# Altium schematic symbol library Sang_library.SchLib: 1607 symbols (part 6 of 15) (continued)
## FT232RL (continued)
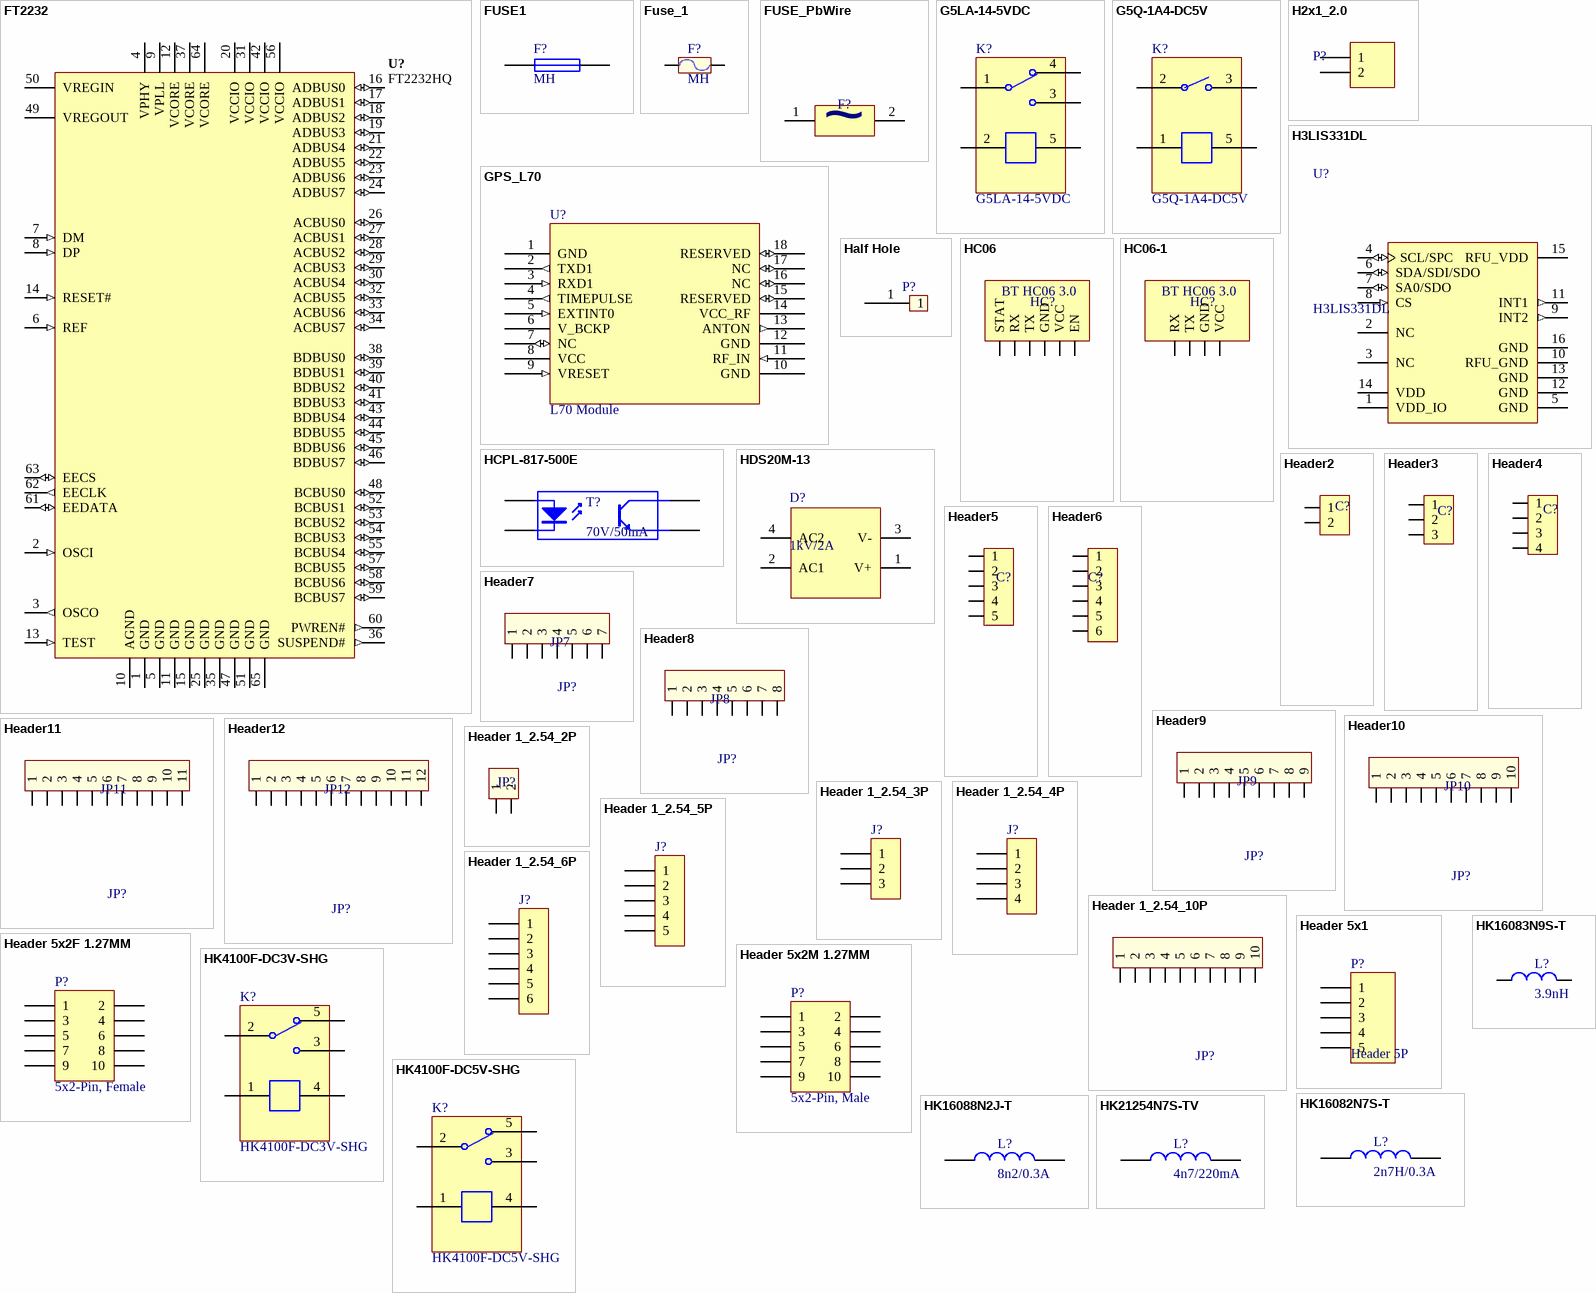
[diagram p41: symbols FT2232 to HK21254N7S-TV]

## FT2232
designator U?, comment FT2232HQ
Dual High Speed USB To Multipurpose UART/FIFO IC, QFN-64, Tray; DatasheetVersion: ver 2.10, Nov-2010; ComponentLink1Description: Manufacturer URL; PackageVersion: 2010; ComponentLink1URL: http://www.ftdichip.com/; PackageReference: QFN64_2; PackageDescription: 64-Pin Quad Flat No-Lead, 9 x 9 mm Body, 0.5 mm Pitch, 4.35 x 4.35 mm Exposed Pad; RevisionNote: URLs added.; ComponentLink2URL: http://www.ftdichip.com/Support/Documents/DataSheets/ICs/DS_FT2232H.pdf; ComponentLink2Description: Datasheet
footprint QFN64M (QFN, 64-Leads, Body 9x9mm, Pitch 0.5mm, IPC High Density)
pins: 1 GND (power), 2 OSCI (in), 3 OSCO (out), 4 VPHY (power), 5 GND (power), 6 REF (in), 7 DM (in), 8 DP (in), 9 VPLL (power), 10 AGND (power), 11 GND (power), 12 VCORE (power), 13 TEST (in), 14 RESET# (in), 15 GND (power), 16 ADBUS0 (io), 17 ADBUS1 (io), 18 ADBUS2 (io), 19 ADBUS3 (io), 20 VCCIO (power), 21 ADBUS4 (io), 22 ADBUS5 (io), 23 ADBUS6 (io), 24 ADBUS7 (io), 25 GND (power), 26 ACBUS0 (io), 27 ACBUS1 (io), 28 ACBUS2 (io), 29 ACBUS3 (io), 30 ACBUS4 (io), 31 VCCIO (power), 32 ACBUS5 (io), 33 ACBUS6 (io), 34 ACBUS7 (io), 35 GND (power), 36 SUSPEND# (out), 37 VCORE (power), 38 BDBUS0 (io), 39 BDBUS1 (io), 40 BDBUS2 (io), 41 BDBUS3 (io), 42 VCCIO (power), 43 BDBUS4 (io), 44 BDBUS5 (io), 45 BDBUS6 (io), 46 BDBUS7 (io), 47 GND (power), 48 BCBUS0 (io), 49 VREGOUT (power), 50 VREGIN (power), 51 GND (power), 52 BCBUS1 (io), 53 BCBUS2 (io), 54 BCBUS3 (io), 55 BCBUS4 (io), 56 VCCIO (power), 57 BCBUS5 (io), 58 BCBUS6 (io), 59 BCBUS7 (io), 60 PWREN# (out), 61 EEDATA (io), 62 EECLK (out), 63 EECS (io), 64 VCORE (power), 65 GND (power)

## FUSE1
designator F?, comment MH
Cắm; Value: *
pins: 1, 2

## Fuse_1
designator F?, comment MH
Dán; Value: Fuse
footprint Fuse (3A)
footprint FUSE1 (De Fuse Box)
footprint FUSE2 (Fuse)
footprint CAU TRI (Cau Tri)
pins: 1, 2

## FUSE_PbWire
designator F?
PB wire fuse; Solder: SMT; CompanyID: VT-xxxx
footprint FUSE_3A_HOLDER
pins: 1, 2
text: ~

## G5LA-14-5VDC
designator K?
5V, 5pin, 10A; Solder: HAND; MPN: G5LA-14-5VDC; CompanyID: *; Value: G5LA-14-5VDC
footprint G5LA-14 (Footprint not found)
pins: 1, 2, 3, 4, 5

## G5Q-1A4-DC5V
designator K?
5V, 5pin, 10A; MPN: G5LA-14-5VDC; Solder: HAND; Value: G5LA-14-5VDC; CompanyID: *
footprint G5Q-1A4-DC5
pins: 1 2, 2, 3, 5

## GPS_L70
designator U?, comment L70 Module
L70 GPS module; Solder: SMT; Value: L70B; MPN: L70B; Category: MODULE
footprint GPS.L70
pins: 1 GND (power), 2 TXD1 (out), 3 RXD1 (in), 4 TIMEPULSE (out), 5 EXTINT0 (in), 6 V_BCKP (power), 7 NC (io), 8 VCC (power), 9 VRESET (in), 10 GND (power), 11 RF_IN (in), 12 GND (power), 13 ANTON (out), 14 VCC_RF (power), 15 RESERVED (io), 16 NC (io), 17 NC (io), 18 RESERVED (io)

## H2x1_2.0
designator P?
Header 2x1, pitch 2mm; Solder: WAVE
footprint HDR200_1x2
pins: 1, 2

## H3LIS331DL
designator U?
ACCEL 100-400G I2C/SPI 16TFLGA; MFR: STMicroelectronics; Solder: SMT; MPN: H3LIS331DL; Value: H3LIS331DL; Category: IC; PinCount: 16
footprint STM-LGA-16_N (Footprint not found)
pins: 1 VDD_IO (power) "Power supply for I/O pins", 2 NC "Not connected", 3 NC "Not connected", 4 SCL/SPC (io) "I2C serial clock (SCL),SPI serial port clock (SPC)", 5 GND (power) "0V supply", 6 SDA/SDI/SDO (io) "I2C serial data (SDA),SPI serial data input (SDI),3-wire interface serial data output (SDO)", 7 SA0/SDO (io) "SPI serial data output (SDO),I2C less significant bit of the device address (SA0)", 8 CS (in) "SPI enable I2C/SPI mode selection (1: I2C mode; 0: SPI enabled)", 9 INT2 (out) "Inertial interrupt 2", 10 RFU_GND (power) "Connect to GND", 11 INT1 (out) "Inertial interrupt 1", 12 GND (power) "0 V supply", 13 GND (power) "Analog to digital converter input 3", 14 VDD (power) "Power supply", 15 RFU_VDD (power), 16 GND (power) "Analog to digital converter input 1"

## Half Hole
designator P?, comment 1  (value not drawn)
footprint Hafl Hole 0.7mm
pins: 1

## HC06
designator HC?
Manufacturer: W¨¹rth Elektronik eiSos GmbH; partNo: 613004143121; ComponentLink1 Description: Manufacturer; ComponentLink2 Description: Datasheet; NoPins: 04; Created Date: 29 March 2013; ComponentLink1URL: http://www.we-online.com; ComponentLink2URL: http://katalog.we-online.de/em/datasheet/6130xx143121.pdf; Created by: Karrer Zheng
footprint HC06
footprint JP6-C1T (6 row, straight, gold plating)
pins: 1 STAT, 2 RX, 3 TX, 4 GND, 5 VCC, 6 EN
text: BT HC06 3.0

## HC06-1
designator HC?
Manufacturer: W¨¹rth Elektronik eiSos GmbH; partNo: 613004143121; ComponentLink1 Description: Manufacturer; ComponentLink2 Description: Datasheet; NoPins: 04; Created Date: 29 March 2013; ComponentLink1URL: http://www.we-online.com; ComponentLink2URL: http://katalog.we-online.de/em/datasheet/6130xx143121.pdf; Created by: Karrer Zheng
footprint HC06-1
footprint JP4-C1T (4 row, straight, gold plating)
pins: 1 RX, 2 TX, 3 GND, 4 VCC
text: BT HC06 3.0

## HCPL-817-500E
designator T?, comment 70V/50mA
OPTOISOLATOR 5KV TRANSISTOR 4SMD; MPN: HCPL-817-500E; Solder: SMT; CompanyID: VT-00147; Value: 70V/50mA
footprint OPTO TRANSISTOR_SMD-4
pins: 1, 2, 3, 4

## HDS20M-13
designator D?, comment 1kV/2A
BRIDGE RECT 1PHASE 1KV 2A HDS; MPN: HDS20M-13; Solder: SMT; Value: 1kV/2A; MFR: *
footprint DIODE_Bridge SMD
pins: 1 V+, 2 AC1, 3 V-, 4 AC2

## Header2
designator C?
Header IDC, 2 x 1 Pin Vertical 2.54mm Pitch (Non-Boxed, Male); Manufacturer: W¨¹rth Elektronik eiSos GmbH; partNo: 613002143121; ComponentLink1 Description: Manufacturer; ComponentLink2 Description: Datasheet; NoPins: 02; Created Date: 29 March 2013; ComponentLink1URL: http://www.we-online.com; ComponentLink2URL: http://katalog.we-online.de/em/datasheet/6130xx143121.pdf; Created by: Karrer Zheng
footprint HDR2 (Connector; Header; 2 Position)
footprint Header2 (CON2)
footprint Header2N (CON2)
pins: 1, 2

## Header3
designator C?
Header IDC, 3 x 1 Pin Vertical 2.54mm Pitch (Non-Boxed, Male); Manufacturer: W¨¹rth Elektronik eiSos GmbH; partNo: 613002143121; ComponentLink1 Description: Manufacturer; ComponentLink2 Description: Datasheet; NoPins: 02; Created Date: 29 March 2013; ComponentLink1URL: http://www.we-online.com; ComponentLink2URL: http://katalog.we-online.de/em/datasheet/6130xx143121.pdf; Created by: Karrer Zheng
footprint HDR3 (Connector; Header; 3 Position)
footprint Header3 (CON 3)
footprint Header3N (CON 3)
pins: 1, 2, 3

## Header4
designator C?
Header IDC, 4 x 1 Pin Vertical 2.54mm Pitch (Non-Boxed, Male); Manufacturer: W¨¹rth Elektronik eiSos GmbH; partNo: 613002143121; ComponentLink1 Description: Manufacturer; ComponentLink2 Description: Datasheet; NoPins: 02; Created Date: 29 March 2013; ComponentLink1URL: http://www.we-online.com; ComponentLink2URL: http://katalog.we-online.de/em/datasheet/6130xx143121.pdf; Created by: Karrer Zheng
footprint HDR4 (Connector; Header; 4 Position)
footprint Header4 (CON4)
footprint Header4N (CON4)
pins: 1, 2, 3, 4

## Header5
designator C?
Header IDC, 5 x 1 Pin Vertical 2.54mm Pitch (Non-Boxed, Male); Manufacturer: W¨¹rth Elektronik eiSos GmbH; partNo: 613002143121; ComponentLink1 Description: Manufacturer; ComponentLink2 Description: Datasheet; NoPins: 02; Created Date: 29 March 2013; ComponentLink1URL: http://www.we-online.com; ComponentLink2URL: http://katalog.we-online.de/em/datasheet/6130xx143121.pdf; Created by: Karrer Zheng
footprint HDR5 (Connector; Header; 5 Position)
footprint Header5 (CON5)
footprint Header5N (CON5)
pins: 1, 2, 3, 4, 5

## Header6
designator C?
Header IDC, 6 x 1 Pin Vertical 2.54mm Pitch (Non-Boxed, Male); Manufacturer: W¨¹rth Elektronik eiSos GmbH; partNo: 613002143121; ComponentLink1 Description: Manufacturer; ComponentLink2 Description: Datasheet; NoPins: 02; Created Date: 29 March 2013; ComponentLink1URL: http://www.we-online.com; ComponentLink2URL: http://katalog.we-online.de/em/datasheet/6130xx143121.pdf; Created by: Karrer Zheng
footprint HDR6 (Connector; Header; 6 Position)
footprint Header6 (CON6)
footprint Header6N (CON6)
pins: 1, 2, 3, 4, 5, 6

## Header7
designator JP?, comment JP7
Connector 7; Value: Connector 7
footprint Header7 (CON7)
footprint Header7N (CON7)
pins: 1, 2, 3, 4, 5, 6, 7

## Header8
designator JP?, comment JP8
Connector 8; Value: Connector 8
footprint Header8 (CON8)
footprint Header8N (CON8)
pins: 1, 2, 3, 4, 5, 6, 7, 8

## Header9
designator JP?, comment JP9
Connector 9; Value: Connector 9
footprint Header9 (CON9)
footprint Header9N (CON9)
pins: 1, 2, 3, 4, 5, 6, 7, 8, 9

## Header10
designator JP?, comment JP10
Connector 10; Value: Connector 10
footprint Header10 (CON10)
footprint Header10N (CON10)
pins: 1, 2, 3, 4, 5, 6, 7, 8, 9, 10

## Header11
designator JP?, comment JP11
Connector 11; Value: Connector 11
footprint Header11 (CON11)
footprint Header11N (CON11)
pins: 1, 2, 3, 4, 5, 6, 7, 8, 9, 10, 11

## Header12
designator JP?, comment JP12
Connector 12; Value: Connector 12
footprint Header12 (CON12)
footprint Header12N (CON12)
pins: 1, 2, 3, 4, 5, 6, 7, 8, 9, 10, 11, 12

## Header 1_2.54_2P
designator JP?
Cắm; Chung_Loai: Cắm
footprint Header_Duc Cong_2P 2.54
pins: 1, 2

## Header 1_2.54_3P
designator J?
Cắm; Ma_Hang: *; Ghi_Chu: *; Don_Vi: *; Kieu_Chan: *; Chung_Loai: Cắm
footprint Header_Duc Cong_3P 2.54
pins: 1, 2, 3

## Header 1_2.54_4P
designator J?
Cắm; Chung_Loai: Cắm
footprint CON4
footprint Header_Duc Cong_4P 2.54
pins: 1, 2, 3, 4

## Header 1_2.54_5P
designator J?
Cắm; Chung_Loai: Cắm
footprint Header_Duc Cong_5P 2.54
pins: 1, 2, 3, 4, 5

## Header 1_2.54_6P
designator J?
Cắm; Don Vi: Con; Chung_Loai: Cắm
footprint Header_Duc Cong_6P 2.54
pins: 1, 2, 3, 4, 5, 6

## Header 1_2.54_10P
designator JP?
Cắm; Don_Vi: Con; Chung_Loai: Cắm
footprint Header_Duc Thang_10P_2.54
pins: 1, 2, 3, 4, 5, 6, 7, 8, 9, 10

## Header 5x1
designator P?, comment Header 5P
Header, 5 Pin Pitch 2.54mm; MPN: S1012EC-40-ND; CompanyID: VT-00125; Solder: WAVE; Value: Header 5P
footprint HDR1X5 (Connector; Header; 5 Position)
pins: 1, 2, 3, 4, 5

## Header 5x2F 1.27MM
designator P?, comment 5x2-Pin, Female
Header Female, 5x2-Pin, Pitch 1.27mm; MPN: 525674025852; CompanyID: VT-01108; Solder: HAND; Value: 5x2-Pin, Female
footprint HDR_5x2_1.27 FEMALE (HDR127_5x2_FEMALE)
pins: 1, 2, 3, 4, 5, 6, 7, 8, 9, 10

## Header 5x2M 1.27MM
designator P?, comment 5x2-Pin, Male
Header Male, 5x2-Pin, Pitch 1.27mm; MPN: 525673713482; CompanyID: VT-01107; Solder: HAND; Value: 5x2-Pin, Male
footprint HDR_5x2_1.27 MALE (HDR127_5x2_MALE)
pins: 1, 2, 3, 4, 5, 6, 7, 8, 9, 10

## HK4100F-DC3V-SHG
designator K?
3V, 6pin, 3A; Solder: HAND; MPN: HK4100F-DC3V-SHG; CompanyID: *; Value: HK4100F-DC3V
footprint HK4100F (Footprint not found)
pins: 1, 2, 3, 4, 5

## HK4100F-DC5V-SHG
designator K?
5V, 6pin, 3A; Solder: HAND; MPN: HK4100F-DC5V-SHG; CompanyID: *; Value: HK4100F-DC5V
footprint HK4100F (Footprint not found)
pins: 1, 2, 3, 4, 5

## HK16082N7S-T
designator L?, comment 2n7H/0.3A
IND-FIXED 2.7nH +- 0.3nH 300mA 100 mOhm 0603; MPN: HK16082N7S-T; CompanyID: VT-01163; Solder: SMT; Value: 2n7H/0.3A; Category: INDUCTOR
footprint IND-0603 (1608) (Resistor, Chip; 1.60 mm L X 0.80 mm W X 0.50 mm H body)
pins: 1, 2

## HK16083N9S-T
designator L?, comment 3.9nH
FIXED IND 3.9NH 300MA 140 MOHM; MPN: HK16083N9S-T; CompanyID: VT-01060; Solder: SMT; Value: 3.9nH; Category: FERRITE BEAD; PinCount: 2
footprint IND-0603 (1608) (Resistor, Chip; 1.60 mm L X 0.80 mm W X 0.50 mm H body)
pins: 1, 2

## HK16088N2J-T
designator L?, comment 8n2/0.3A
FIXED IND 8.2nH 300mA 240 mOHM; MPN: HK16088N2J-T; Solder: SMT; CompanyID: VT-01352; Value: 8n2/0.3A; Category: INDUCTOR
footprint INDUCTOR-0603 (Inductor, Chip; 1.60 mm L X 0.80 mm W X 1.40 mm H body)
pins: 1, 2

## HK21254N7S-TV
designator L?, comment 4n7/220mA
IND-FIXED 4.7nH 220mA 200 mOhm 0805; MPN: HK21254N7S-TV; Solder: SMT; CompanyID: VT-00954; Value: 4n7/220mA; Category: INDUCTOR
footprint INDUCTOR-0805 (Inductor, Chip; 2.00 mm L X 1.25 mm W X 1.50 mm H body)
pins: 1, 2

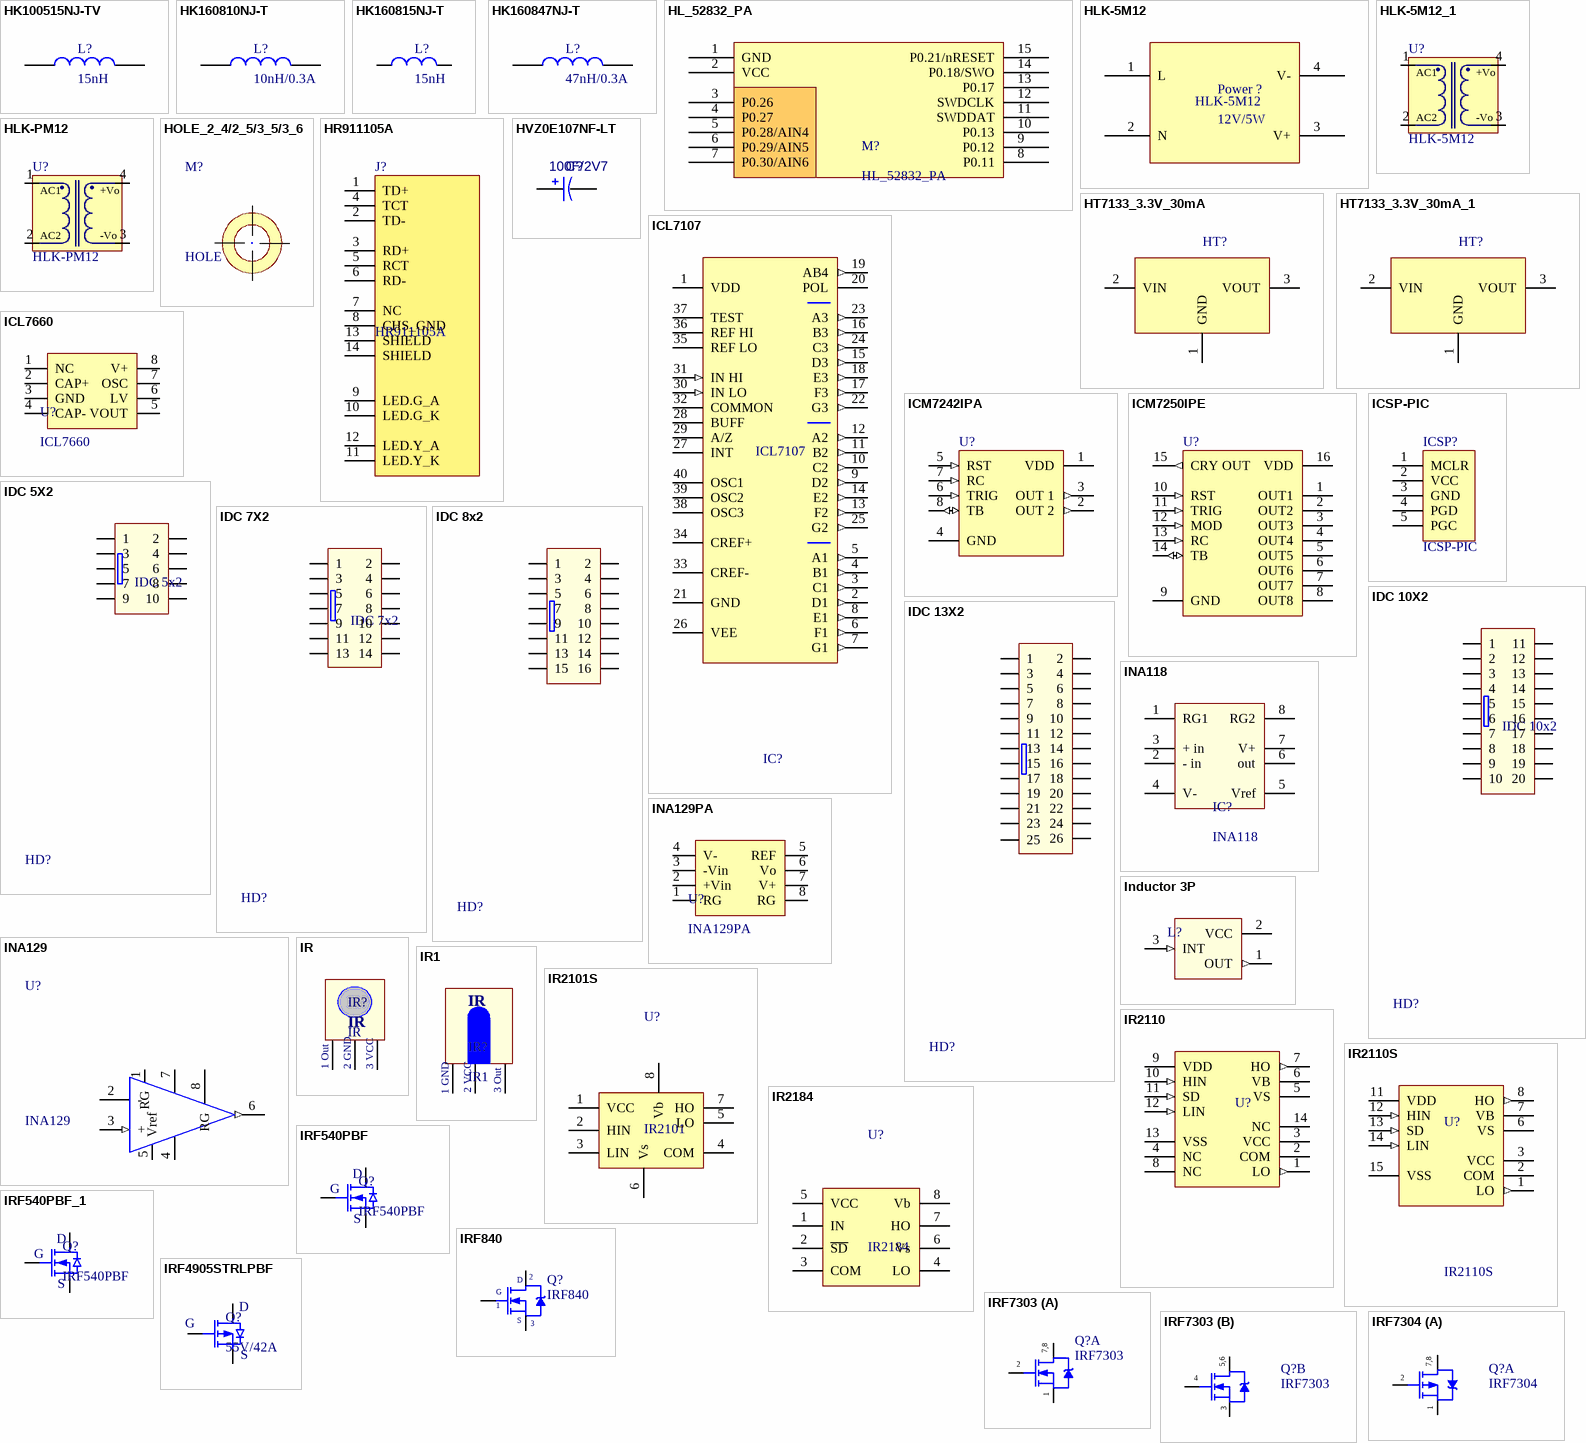
[diagram p42: symbols HK100515NJ-TV to IRF7304]

## HK100515NJ-TV
designator L?, comment 15nH
FIXED IND 15NH 300MA 460 MOHM; MPN: HK100515NJ-TV; MFR: Taiyo Yuden; Sloder: 0402; Value: 15nH; Category: Inductor; Digikey MPN: 587-3998-1-ND
footprint IND-0402 (1005) (Resistor Chip, Body 1.0x0.5mm, IPC High Density)
pins: 1, 2

## HK160810NJ-T
designator L?, comment 10nH/0.3A
IND-FIXED 10nH 5% 300mA 260 mOhm 0603; MPN: HK160810NJ-T; CompanyID: VT-01233; Solder: SMT; Value: 10nH/0.3A; Category: INDUCTOR
footprint INDUCTOR-0603 (Inductor, Chip; 1.60 mm L X 0.80 mm W X 1.40 mm H body)
pins: 1, 2

## HK160815NJ-T
designator L?, comment 15nH
FIXED IND 15NH 300MA 320 MOHM; MPN: HK160815NJ-T; CompanyID: VT-01060; Solder: SMT; Value: 15nH; Category: FERRITE BEAD; PinCount: 2
footprint IND-0603 (1608) (Resistor, Chip; 1.60 mm L X 0.80 mm W X 0.50 mm H body)
pins: 1, 2

## HK160847NJ-T
designator L?, comment 47nH/0.3A
IND-FIXED 47nH 300mA 700 mOhm 0603; MPN: HK160847NJ-T; Solder: SMT; CompanyID: VT-01263; Value: 47nH/0.3A; Category: INDUCTOR
footprint IND-0603 (1608) (Resistor, Chip; 1.60 mm L X 0.80 mm W X 0.50 mm H body)
pins: 1, 2

## HL_52832_PA
designator M?
Solder: SMT; MPN: HL_52832_PA; Value: HL_52832_PA; Category: MODULE
footprint HL_52832_PA
pins: 1 GND, 2 VCC, 3 P0.26, 4 P0.27, 5 P0.28/AIN4, 6 P0.29/AIN5, 7 P0.30/AIN6, 8 P0.11, 9 P0.12, 10 P0.13, 11 SWDDAT, 12 SWDCLK, 13 P0.17, 14 P0.18/SWO, 15 P0.21/nRESET

## HLK-5M12
designator Power ?, comment 12V/5W
HLK-5M12  AC/DC 12V/5W
footprint HLK-5M12 (12V/5W)
pins: 1 L (power), 2 N (power), 3 V+, 4 V-

## HLK-5M12_1
designator U?, comment HLK-5M12
Ultra-compact module power 12V/5W; MFR: Hi-link; Solder: WAVE; Category: MODULE; MPN: HLK-5M12; PinCount: 4; Value: 12V/5W
footprint HLK-5M12 (Power AC-DC, Body 38x23mm, IPC High Density)
pins: 1 AC, 2, 3, 4
text: AC1; +Vo; AC2; -Vo

## HLK-PM12
designator U?
Ultra-compact module power; MFR: Hi-link; Solder: WAVE; Value: 12V/3W; Category: MODULE; MPN: HLK-PM12; PinCount: 4
footprint HLK-PM12 (Power AC-DC, Body 34x20.2mm, IPC High Density)
pins: 1 AC, 2, 3, 4
text: AC1; +Vo; AC2; -Vo

## HOLE_2_4/2_5/3_5/3_6
designator M?, comment HOLE  (no BOM)
HOLE 2_4/2_5/3_5/3_6; MPN: None; Solder: Not Fill; CompanyID: VT-; ClassName: MECH_HOLE; Value: HOLE
footprint HOLE_3MM_5MM
footprint HOLE_2MM_4MM
footprint HOLE_2MM_5MM
footprint HOLE_3MM_6MM

## HR911105A
designator J?
Hanrun HR911105A RJ-45 Connector; Solder: WAVE; MPN: HR911105A; MFR: HanRun; Value: HR911105A
footprint HR911105A (Hanrun HR911105A RJ-45 Connector)
pins: 1 TD+, 2 TD-, 3 RD+, 4 TCT, 5 RCT, 6 RD-, 7 NC, 8 CHS_GND, 9 LED.G_A, 10 LED.G_K, 11 LED.Y_K, 12 LED.Y_A, 13 SHIELD, 14 SHIELD

## HT7133_3.3V_30mA
designator HT?, comment HT7133 3.3V 30mA  (value not drawn)
footprint SOT89-150P410X160-3N (SOT89, 3-Leads, Body 4.5x2.4mm (max), Pitch 1.50mm, Lead Span 4.1mm, IPC Medium Density)
pins: 1 GND, 2 VIN, 3 VOUT

## HT7133_3.3V_30mA_1
designator HT?, comment HT7133 3.3V 30mA  (value not drawn)
footprint SOT89-150P410X160-3N (SOT89, 3-Leads, Body 4.5x2.4mm (max), Pitch 1.50mm, Lead Span 4.1mm, IPC Medium Density)
pins: 1 GND, 2 VIN, 3 VOUT

## HVZ0E107NF-LT
designator C?, comment 100F/2V7
2V7 100F ESR=30Ohms; MPN: HVZ0E107NF-LT; Solder: HAND; CompanyID: VT-01310; Value: 100F/2V7; Category: CAPACITOR; PinCount: 2
footprint CAP_ALUM_D12.5_S5.0 - L35 FLAT
pins: 1, 2

## ICL7107
designator IC?
Dipslay voltage 0 - 1999; Value: ICL7107
footprint DIP40/W0.6 (40 PIN, W 600mil, Pin to pin 100mil)
pins: 1 VDD (power), 2 D1 (out), 3 C1 (out), 4 B1 (out), 5 A1 (out), 6 F1 (out), 7 G1 (out), 8 E1 (out), 9 D2 (out), 10 C2 (out), 11 B2 (out), 12 A2 (out), 13 F2 (out), 14 E2 (out), 15 D3 (out), 16 B3 (out), 17 F3 (out), 18 E3 (out), 19 AB4 (out), 20 POL, 21 GND (power), 22 G3 (out), 23 A3 (out), 24 C3 (out), 25 G2 (out), 26 VEE (power), 27 INT, 28 BUFF, 29 A/Z, 30 IN LO (in), 31 IN HI (in), 32 COMMON, 33 CREF-, 34 CREF+, 35 REF LO, 36 REF HI, 37 TEST, 38 OSC3, 39 OSC2, 40 OSC1

## ICL7660
designator U?
CMOS Voltage Converters; Creator: Nguyen Ba Bien
footprint DIP8
footprint SO8 (SOIC, 8-Leads, Body 4.9x3.9mm, Pitch 1.27mm, IPC High Density)
pins: 1 NC, 2 CAP+, 3 GND, 4 CAP-, 5 VOUT, 6 LV, 7 OSC, 8 V+

## ICM7242IPA
designator U?
Fixed and Programmable Timer/ Counter; Published: 16-Jan-2001; LatestRevisionDate: 29-May-2009; LatestRevisionNote: Component Body Added.; PackageVersion: RevB, 21-0043; PackageReference: PA8; Publisher: Altium Limited; PackageDescription: DIP, 8-Pin, Row Spacing 7.62 mm, Pitch 2.54 mm; Code_JEDEC: MS-001-AB; ComponentLink1Description: Manufacturer Link; ComponentLink1URL: http://www.maxim-ic.com/; ComponentLink2Description: Datasheet; ComponentLink2URL: http://pdfserv.maxim-ic.com/en/ds/ICM7240-ICM7260.pdf
footprint DIP8
pins: 1 VDD (power), 2 OUT 2 (out), 3 OUT 1 (out), 4 GND (power), 5 RST (in), 6 TRIG (in), 7 RC (in), 8 TB (io)

## ICM7250IPE
designator U?
Fixed and Programmable Timer/ Counter; Published: 16-Jan-2001; LatestRevisionDate: 29-May-2009; LatestRevisionNote: Component Body Added.; PackageVersion: 1997; PackageReference: PE16A; Publisher: Altium Limited; PackageDescription: DIP, 16-Pin, Row Spacing 7.62 mm, Pitch 2.54 mm; Code_JEDEC: MS-001-BB; ComponentLink1Description: Manufacturer Link; ComponentLink1URL: http://www.maxim-ic.com/; ComponentLink2Description: Datasheet; ComponentLink2URL: http://pdfserv.maxim-ic.com/en/ds/ICM7240-ICM7260.pdf
footprint DIP16
pins: 1 OUT1 (oc), 2 OUT2 (oc), 3 OUT3 (oc), 4 OUT4 (oc), 5 OUT5 (oc), 6 OUT6 (oc), 7 OUT7 (oc), 8 OUT8 (oc), 9 GND (power), 10 RST (in), 11 TRIG (in), 12 MOD (in), 13 RC (in), 14 TB (io), 15 CRY OUT (out), 16 VDD (power)

## ICSP-PIC
designator ICSP?
Header, 5-Pin; LatestRevisionDate: 17-Jul-2002; LatestRevisionNote: Re-released for DXP Platform.; Publisher: Altium Limited
footprint JP5-D1T (5 pins, 1 row, straight, gold plating)
pins: 1 MCLR, 2 VCC, 3 GND, 4 PGD, 5 PGC

## IDC 5X2
designator HD?, comment IDC 5x2
Value: Header 5x2
footprint IDC10-BH
footprint IDC10
footprint IDC10-S
pins: 1, 2, 3, 4, 5, 6, 7, 8, 9, 10

## IDC 7X2
designator HD?, comment IDC 7x2
Value: Header 5x2
footprint IDC14
pins: 1, 2, 3, 4, 5, 6, 7, 8, 9, 10, 11, 12, 13, 14

## IDC 8x2
designator HD?, comment IDC 8X2  (value not drawn)
Value: Header 5x2
footprint IDC16
pins: 1, 2, 3, 4, 5, 6, 7, 8, 9, 10, 11, 12, 13, 14, 15, 16

## IDC 10X2
designator HD?, comment IDC 10x2
Value: Header 5x2
footprint IDC20 (Header 10x2,20 pin, connecter)
footprint IDC20-S (IDC20 EDGE SOLDERED)
footprint IDC20-B
pins: 1, 2, 3, 4, 5, 6, 7, 8, 9, 10, 11, 12, 13, 14, 15, 16, 17, 18, 19, 20

## IDC 13X2
designator HD?
IDC 13x2; Value: Header 5x2
footprint IDC26-B
footprint IDC26-S (IDC26 EDGE SOLDERED)
pins: 1, 2, 3, 4, 5, 6, 7, 8, 9, 10, 11, 12, 13, 14, 15, 16, 17, 18, 19, 20, 21, 22, 23, 24, 25, 26

## INA118
designator IC?
Precision, Low Power  INSTRUMENTATION AMPLIFIER; Designed by: VanDungEvn; Value: INA118
footprint DIP8
footprint SO8
pins: 1 RG1, 2 - in, 3 + in, 4 V-, 5 Vref, 6 out, 7 V+, 8 RG2

## INA129
designator U?
IC INST AMP 1 CIRCUIT 8SOIC; MPN: INA129UA/2K5; MFR: TI; Solder: SMT; Value: INA129; Category: IC; PinCount: 8
footprint SOIC-8
pins: 1 RG, 2 -, 3 + (in), 4 V-, 5 Vref, 6 Vout (out), 7 V+, 8 RG

## INA129PA
designator U?
footprint DIP8
footprint SO8 (SOIC, 8-Leads, Body 4.9x3.9mm, Pitch 1.27mm, IPC High Density)
pins: 1 RG, 2 +Vin, 3 -Vin, 4 V-, 5 REF, 6 Vo, 7 V+, 8 RG

## Inductor 3P
designator L?
footprint Inductor 3P (Tu hoa < 22uF/16>50V)
pins: 1 OUT (out), 2 VCC (power), 3 INT (in)

## IR
designator IR?
Receiver Infraed IC
footprint JP3-C1T (3 row, straight, gold plating)
footprint IR (Receiver Infared IC)
pins: 1 Out, 2 GND, 3 VCC
text: 1 Out; 2 GND; 3 VCC

## IR1
designator IR?
Receiver Infraed IC
footprint IR2 (Receiver Infared IC)
pins: 1 Out, 2 GND, 3 VCC
text: IR; 1 GND; 2 VCC; 3 Out

## IR2101S
designator U?, comment IR2101
Half-Bridge Driver
footprint DIP8
footprint SO8 (SOIC, 8-Leads, Body 4.9x3.9mm, Pitch 1.27mm, IPC High Density)
pins: 1 VCC, 2 HIN, 3 LIN, 4 COM, 5 LO, 6 Vs, 7 HO, 8 Vb

## IR2110
designator U?
High and Low Side Driver; Note: Pins 4, 8 and 14 are not connected; Published: 8-Jun-2000; LatestRevisionDate: 04-Mar-2005; LatestRevisionNote: Stylized 3D Model Added.; DatasheetVersion: PD60147J; PackageReference: PDIP14; Publisher: Altium Limited; PackageDescription: DIP; 14 Leads; Row Spacing 7.62 mm; Pitch 2.54 mm; ComponentLink1Description: Manufacturer Link; ComponentLink1URL: http://www.irf.com/; ComponentLink2Description: Datasheet; ComponentLink2URL: http://www.irf.com/product-info/datasheets/data/ir2110.pdf
footprint DIP14
footprint DIP14_SOCKET
pins: 1 LO (out), 2 COM (power), 3 VCC (power), 4 NC, 5 VS (power), 6 VB (power), 7 HO (out), 8 NC, 9 VDD (power), 10 HIN (in), 11 SD (in), 12 LIN (in), 13 VSS (power), 14 NC

## IR2110S
designator U?
High and Low Side Driver; Note: Pins 4, 8 and 14 are not connected; Published: 8-Jun-2000; LatestRevisionDate: 04-Mar-2005; LatestRevisionNote: Stylized 3D Model Added.; DatasheetVersion: PD60147J; PackageReference: PDIP14; Publisher: Altium Limited; PackageDescription: DIP; 14 Leads; Row Spacing 7.62 mm; Pitch 2.54 mm; ComponentLink1Description: Manufacturer Link; ComponentLink1URL: http://www.irf.com/; ComponentLink2Description: Datasheet; ComponentLink2URL: http://www.irf.com/product-info/datasheets/data/ir2110.pdf
footprint SO16L (SOIC, 16-Leads, Body 10.30x7.50mm, Pitch 1.27mm, IPC Medium Density)
pins: 1 LO (out), 2 COM (power), 3 VCC (power), 6 VS (power), 7 VB (power), 8 HO (out), 11 VDD (power), 12 HIN (in), 13 SD (in), 14 LIN (in), 15 VSS (power)

## IR2184
designator U?
Half-Bridge Driver
footprint DIP8
footprint SO8 (SOIC, 8-Leads, Body 4.9x3.9mm, Pitch 1.27mm, IPC High Density)
pins: 1 IN, 2 ~{SD}, 3 COM, 4 LO, 5 VCC, 6 Vs, 7 HO, 8 Vb

## IRF540PBF
designator Q?
MOSFET N-CH 100V 28A TO-220AB; Solder: WAVE; Value: IRF540PBF; MPN: IRF540PBF; CompanyID: *
pins: 1 G, 2 D, 3 S

## IRF540PBF_1
designator Q?, comment IRF540PBF
MOSFET N-CH 100V 28A TO-220AB; Solder: WAVE; Value: IRF540PBF; MPN: IRF540PBF; CompanyID: *
pins: 1 G, 2 D, 3 S

## IRF840
designator Q?
MOSFET N - CHANNEL 500V - 0.75 - 8A - TO-220; Value: IRF840
footprint TO220H1 (TO-220 - 1-2-3)
footprint TO220-123 (TO-220 - 1-2-3)
footprint TO220NH (TO-220 - 1-2-3)
footprint TO220H3 (TO-220 1-2-3)
footprint TO220H2 (TO-220 - 1-2-3)
pins: 1 G, 2 D, 3 S

## IRF4905STRLPBF
designator Q?, comment 55V/42A
MOSFET P-CH 55V 42A D2PAK; MPN: IRF4905STRLPBF; CompanyID: VT-00834; Solder: SMT; Value: 55V/42A
footprint TO263_3 (DPAK, 5.08 mm pitch; 2 pin, 9.08 mm L X 10.16 mm W X 4.80 mm H body)
pins: 1 G, 2 S, 3 D

## IRF7303
designator Q?
HEXFET Power MOSFET; Published: 8-Jun-2000; LatestRevisionDate: 13-Apr-2006; LatestRevisionNote: IPC-7351 Footprint Added.; DatasheetVersion: Aug-1997; PackageVersion: Feb-2001; PackageReference: SO-8; Publisher: Altium Limited; PackageDescription: 8-Pin Plastic Small Outline Integrated Circuit 1.27 mm Pitch; Code_JEDEC: MS-012-AA; Code_IPC: SOIC127P600-8; ComponentLink1Description: Manufacturer Link; ComponentLink1URL: http://www.irf.com/; ComponentLink2Description: Datasheet; ComponentLink2URL: http://www.irf.com/product-info/datasheets/data/irf7303.pdf
footprint SO8
footprint DIP8
part A pins: 1 S, 2 G, 7 D, 8 D
part B pins: 3 S, 4 G, 5 D, 6 D
part A text: 7,8
part B text: 5,6

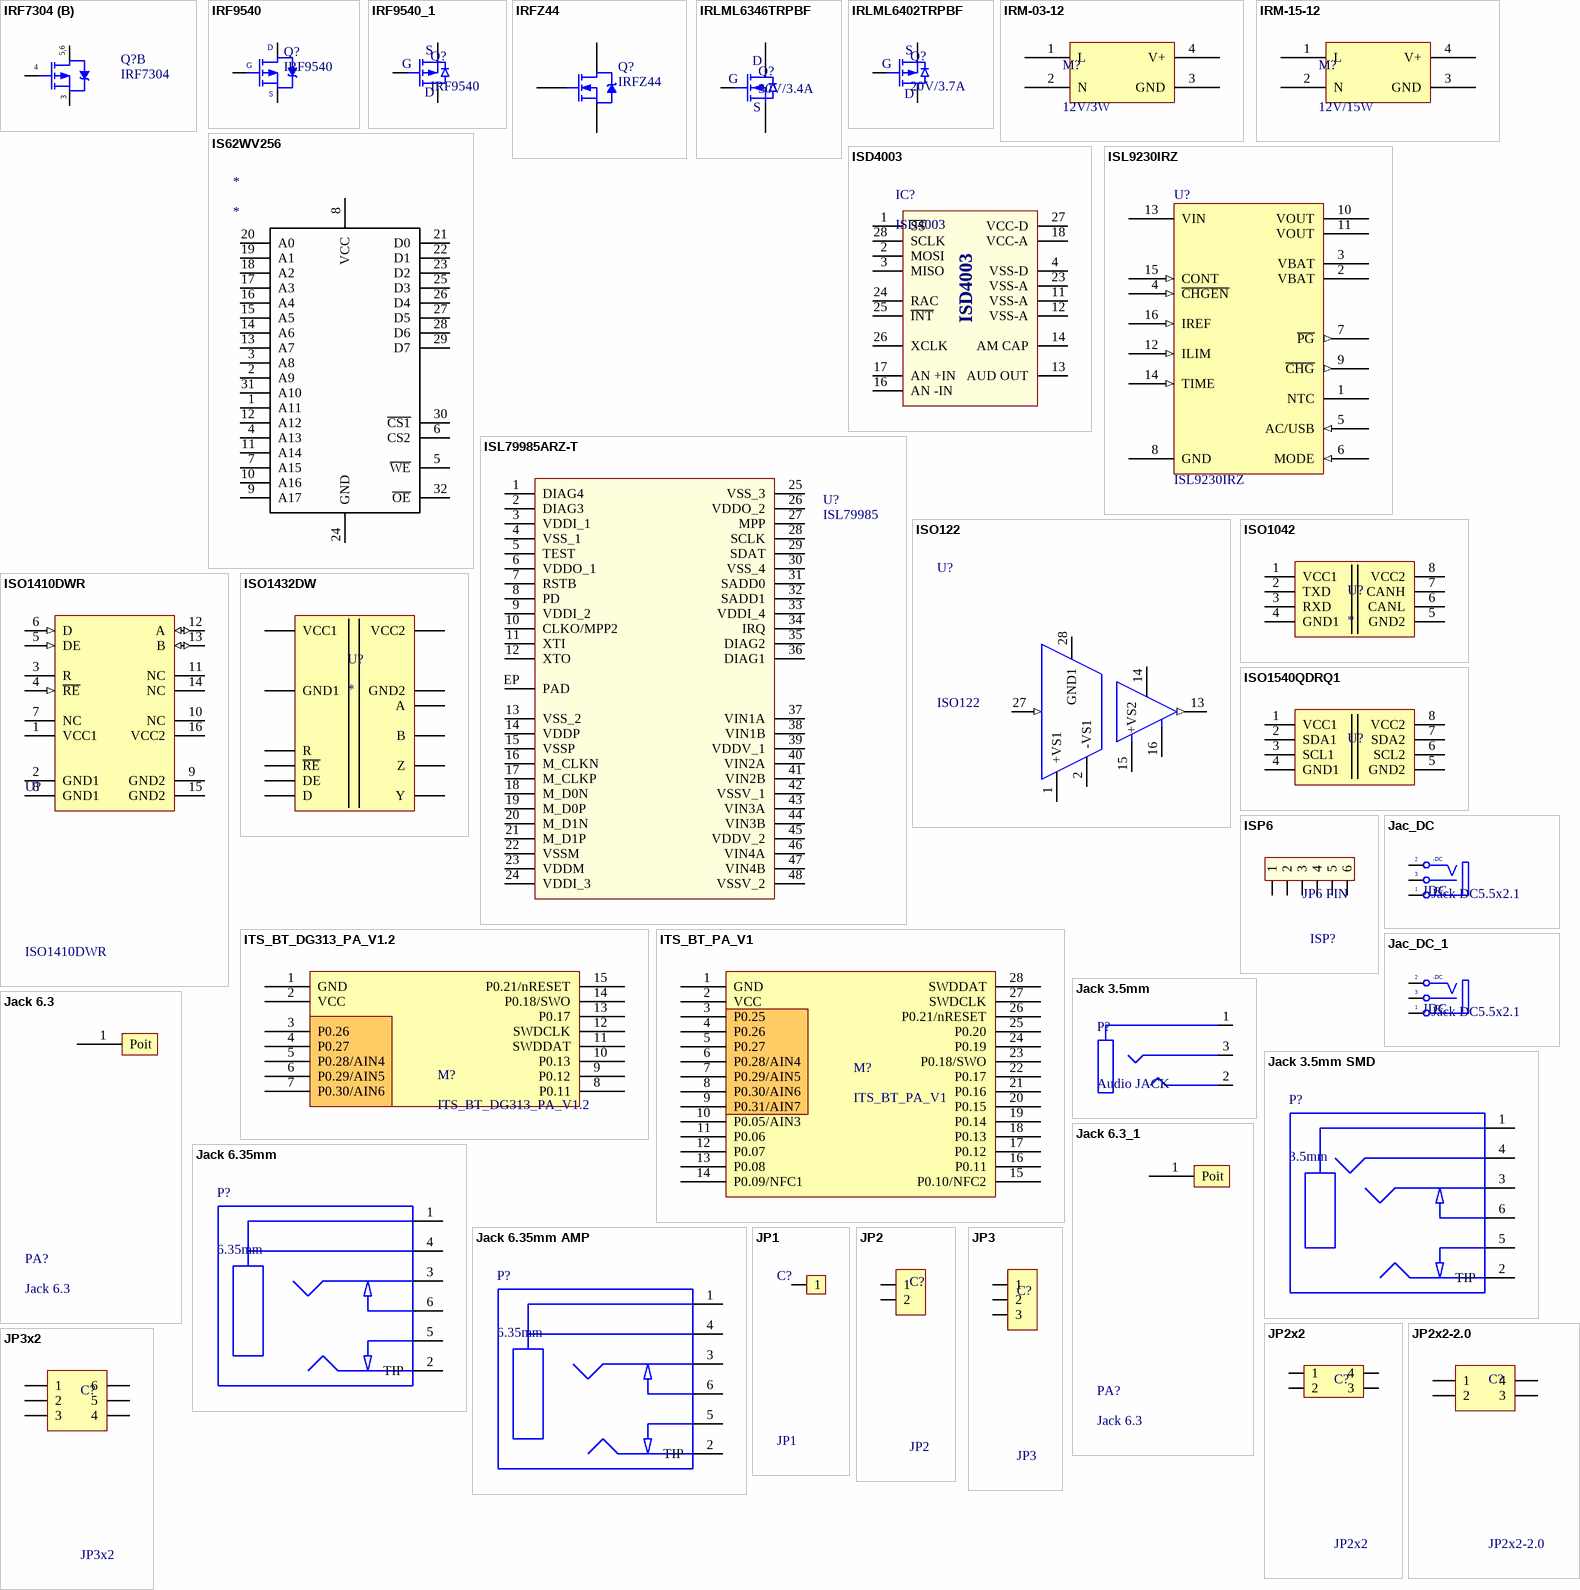
[diagram p43: symbols IRF7304 to JP3x2]

## IRF7304
designator Q?
HEXFET Power MOSFET; Published: 8-Jun-2000; LatestRevisionDate: 13-Apr-2006; LatestRevisionNote: IPC-7351 Footprint Added.; DatasheetVersion: Aug-1997; PackageVersion: Feb-2001; PackageReference: SO-8; Publisher: Altium Limited; PackageDescription: 8-Pin Plastic Small Outline Integrated Circuit 1.27 mm Pitch; Code_JEDEC: MS-012-AA; Code_IPC: SOIC127P600-8; ComponentLink1Description: Manufacturer Link; ComponentLink1URL: http://www.irf.com/; ComponentLink2Description: Datasheet; ComponentLink2URL: http://www.irf.com/product-info/datasheets/data/irf7304.pdf
footprint SO8
footprint DIP8
part A pins: 1 S, 2 G, 7 D, 8 D
part B pins: 3 S, 4 G, 5 D, 6 D
part A text: 7,8
part B text: 5,6

## IRF9540
designator Q?
HEXFET P-Channel Power MOSFET; Value: IRF840
footprint TO220H1 (TO-220 - 1-2-3)
footprint TO220-123 (TO-220 - 1-2-3)
footprint TO220NH (TO-220 - 1-2-3)
footprint TO220H3 (TO-220 1-2-3)
footprint TO220H2 (TO-220 - 1-2-3)
pins: 1 G, 2 D, 3 S